# Altium footprint library smd_ind.PcbLib: 11 footprints
Each footprint in its own frame and in the unit in brackets; x right, y up, seen from the top. Pads: shape width x height; smd on the part's side, far side on the other; paste and mask are expansions set on the pad; w line width, h text height; cw(c..) or ccw(c..) is an arc to the next point about the centre after c.
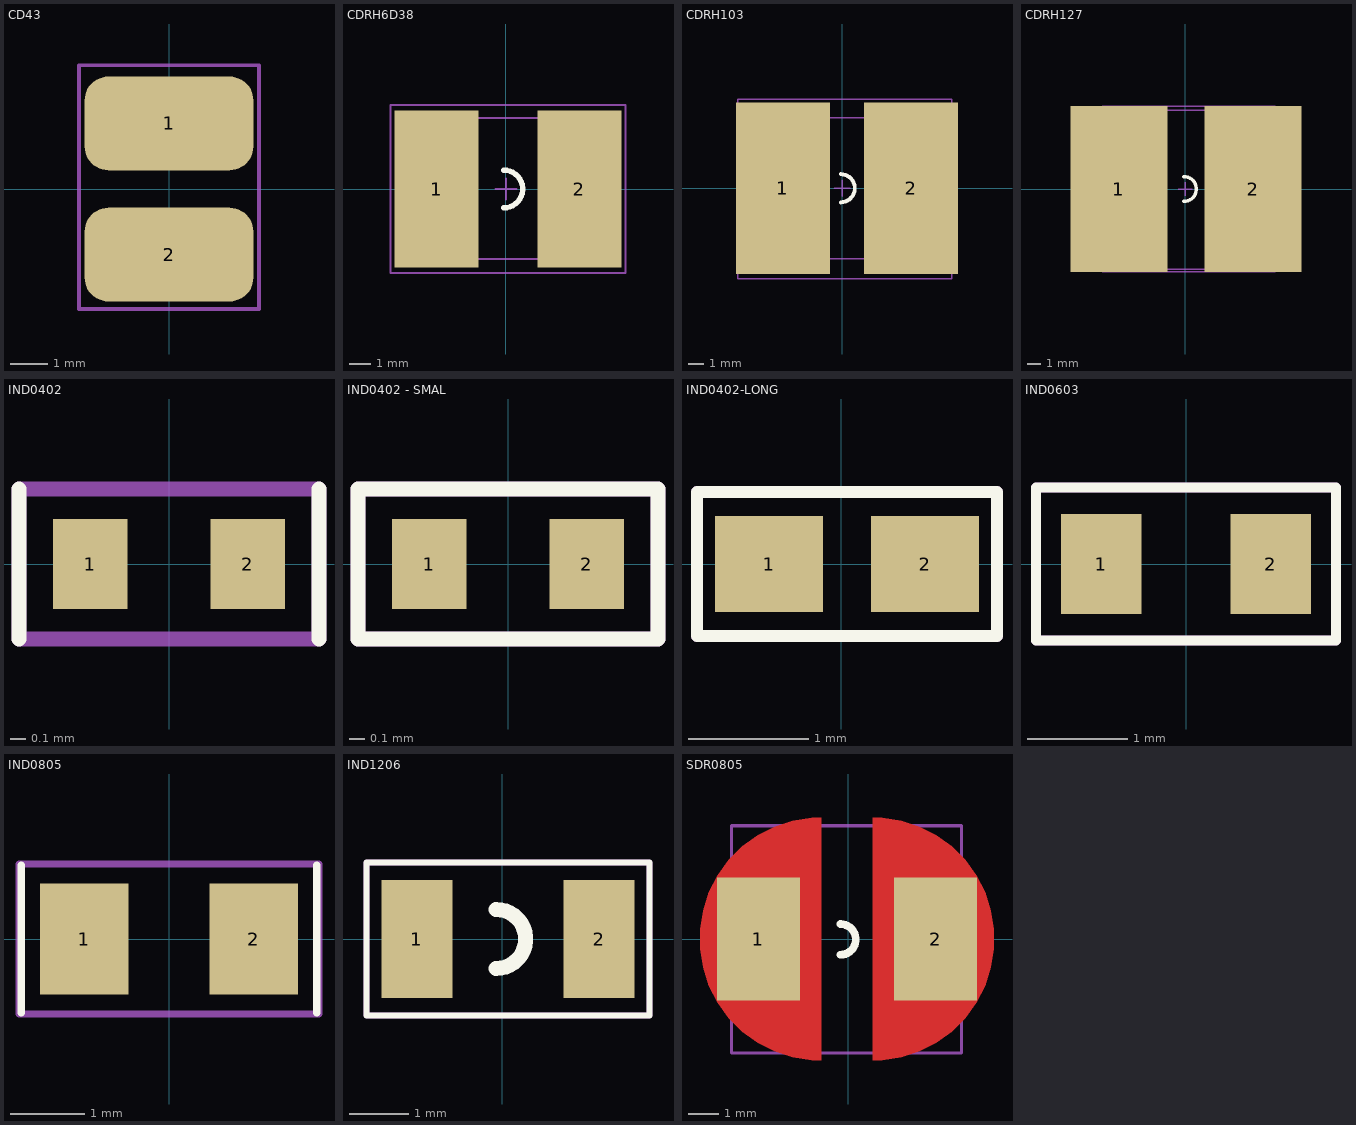
[diagram p0: the footprints below, top view; thin cyan lines are the x and y axes]

## CD43 [mm] "индуктивность"
pads (2):
  rrect50% 4.5x2.5 smd: 1(0,1.75) 2(0,-1.75)
Mechanical 29:
  lines w0.1: -2.4,3.1 -2.4,3.3 2.4,3.3 2.4,-3.2 -2.4,-3.2 -2.4,3.2
  text ".Designator" at -1.9,-0.2 h1
3D body "inductor CD43NP.step": height 3.5, standoff 0, extent -2.15,-2.4 2.15,2.4

## CDRH6D38 [mm]
pads (2):
  rect 4x7.5 smd: 1(-3.3,0) 2(3.5,0)
Top Overlay:
  lines w0.254: -0.1,-0.9 ccw(c-0.1,0) -0.1,0.9
Mechanical 13:
  lines w0.1: -3.277,-3.327 3.429,-3.327 3.429,3.378 -3.277,3.378 -3.277,-3.327
Mechanical 15:
  lines w0.1: -0.5,0 0.5,0 ; 0,-0.5 0,0.5 ; -5.5,-4 -5.5,4 5.7,4 5.7,-4 -5.5,-4
3D body "SUMIDA-CDRH6D28.step": height 3, standoff 0.1, extent -3.274,-3.35 3.426,3.35

## CDRH103 [mm]
pads (2):
  rect 6x11 smd: 1(-3.8,0) 2(4.4,0)
Top Overlay:
  lines w0.254: -0.1,-0.9 ccw(c-0.1,0) -0.1,0.9
Mechanical 13:
  lines w0.1: -4.6,-4.5 -4.6,4.5 5.2,4.5 5.2,-4.5 -4.6,-4.5
Mechanical 15:
  lines w0.1: -0.5,0 0.5,0 ; 0,-0.5 0,0.5 ; -6.7,-5.8 7,-5.8 7,5.7 -6.7,5.7 -6.7,-5.8
3D body "CDRH104.step": height 5, standoff 0, extent -4.6,-4.45 5.2,4.45

## CDRH127 [mm]
pads (2):
  rect 7x12 smd: 1(-4.8,0) 2(4.9,0)
Top Overlay:
  lines w0.254: -0.1,-0.9 ccw(c-0.1,0) -0.1,0.9
Mechanical 13:
  lines w0.1: -6,-6 -6,6 6.5,6 6.5,-6 -6,-6
Mechanical 15:
  lines w0.1: -0.5,0 0.5,0 ; 0,-0.5 0,0.5 ; -6.7,-5.8 7,-5.8 7,5.7 -6.7,5.7 -6.7,-5.8
3D body "CDRH127.step": height 7.5, standoff 0.05, extent -5.871,-6 6.471,6

## IND0402 [mm]
pads (2):
  rect 0.5x0.6 smd: 1(-0.525,0) 2(0.525,0)
Top Overlay:
  lines w0.1: -1,-0.5 -1,0.5 ; 1,-0.5 1,0.5
Mechanical 29:
  lines w0.1: -1,-0.5 -1,0.5 1,0.5 1,-0.5 -1,-0.5
  text ".Designator" at -1,-0.3 h0.7
  text ".Comment" at -0.635,0.672 h0.7
3D body "CAP0402.step": height 0.5, standoff 0, extent -0.5,-0.25 0.5,0.25

## IND0402 - SMAL [mm]
pads (2):
  rect 0.5x0.6 smd: 1(-0.525,0) 2(0.525,0)
Top Overlay:
  lines w0.1: -1,-0.5 -1,0.5 1,0.5 1,-0.5 -1,-0.5
Mechanical 29:
  lines w0.1: -1,-0.5 -1,0.5 1,0.5 1,-0.5 -1,-0.5
  text ".Designator" at -1,-0.3 h1
3D body "CAP0402.step": height 0.5, standoff 0, extent -0.5,-0.25 0.5,0.25

## IND0402-LONG [mm]
pads (2):
  rect 0.9x0.8 smd: 1(-0.6,0) 2(0.7,0)
Top Overlay:
  lines w0.1: -1.2,-0.6 -1.2,0.6 1.3,0.6 1.3,-0.6 -1.2,-0.6
Mechanical 29:
  lines w0.1: -1.2,-0.6 -1.2,0.6 1.3,0.6 1.3,-0.6 -1.2,-0.6
  text ".Designator" at -1,-0.3 h1
3D body "CAP0402.step": height 0.5, standoff 0, extent -0.5,-0.25 0.5,0.25

## IND0603 [mm] "2-Leads, Body 2,0x1,3mm, IPC Medium Density"
height 0.5
pads (2):
  rect 0.8x1 smd: 1(-0.847,0) 2(0.847,0)
Top Overlay:
  lines w0.1: -1.499,-0.762 1.499,-0.762 1.499,0.762 -1.499,0.762 -1.499,-0.762
Mechanical 29:
  lines w0.1: -1.499,-0.762 1.499,-0.762 1.499,0.762 -1.499,0.762 -1.499,-0.762
  text ".Comment" at -1.289,0.872 h0.7
  text ".Designator" at -0.94,-0.178 h1
3D body "45629.stp": height 0.8, standoff 0, extent -0.8,-0.4 0.8,0.4

## IND0805 [mm]
pads (2):
  rect 1.2x1.5 smd: 1(-1.148,0) 2(1.148,0)
Top Overlay:
  lines w0.1: -2,-1 -2,1 ; 2,-1 2,1
Mechanical 29:
  lines w0.1: -2.032,-1.016 2.032,-1.016 2.032,1.016 -2.032,1.016 -2.032,-1.016
  text ".Designator" at -0.619,-0.173 h0.7
  text ".Comment" at -1.651,1.307 h0.7
3D body "IND0805.step": height 1.9, standoff 0.05, extent -1.05,-0.75 1.05,0.75

## IND1206 [mm]
pads (2):
  rect 1.2x2 smd: 1(-1.444,0) 2(1.644,0)
Top Overlay:
  lines w0.1: -2.3,-1.3 -2.3,1.3 2.5,1.3 2.5,-1.3 -2.3,-1.3
  lines w0.254: -0.1,-0.5 ccw(c-0.1,0) -0.1,0.5
Mechanical 29:
  lines w0.1: -2.3,-1.3 -2.3,1.3 2.5,1.3 2.5,-1.3 -2.3,-1.3
  text ".Designator" at -1.9,-0.5 h1.5
3D body "IND1206.step": height 1.8, standoff 0, extent -1.7,-0.818 1.7,0.798

## SDR0805 [mm]
pads (2):
  rect 2.7x4 smd: 1(-2.92,0.012) 2(2.849,0.012)
Top Layer:
  region: -0.87,-3.938 -0.87,3.963 -1.181,3.963 -1.796,3.866 -2.387,3.674 -2.941,3.392 -3.444,3.026 -3.884,2.586 -4.249,2.083 -4.532,1.529 -4.724,0.938 -4.821,0.323 -4.821,-0.298 -4.724,-0.913 -4.532,-1.504 -4.249,-2.058 -3.884,-2.561 -3.444,-3.001 -2.941,-3.367 -2.387,-3.649 -1.796,-3.841 -1.181,-3.938
  region: 0.8,-3.938 0.8,3.963 1.111,3.963 1.725,3.866 2.317,3.674 2.871,3.392 3.374,3.026 3.814,2.586 4.179,2.083 4.461,1.529 4.654,0.938 4.751,0.323 4.751,-0.298 4.654,-0.913 4.461,-1.504 4.179,-2.058 3.814,-2.561 3.374,-3.001 2.871,-3.367 2.317,-3.649 1.725,-3.841 1.111,-3.938
Top Overlay:
  lines w0.254: -0.249,-0.5 ccw(c-0.249,0) -0.249,0.5
Mechanical 13:
  lines w0.1: -3.8,-3.7 3.7,-3.7 3.7,3.7 -3.8,3.7 -3.8,-3.7
3D body "SDR0805.step": height 5.15, standoff 0.1, extent -3.712,-3.745 3.642,3.755